# Altium footprint library STM32F0.PcbLib: 228 footprints (part 16 of 16)
Each footprint in its own frame and in the unit in brackets; x right, y up, seen from the top. Pads: shape width x height; smd on the part's side, far side on the other; paste and mask are expansions set on the pad; w line width, h text height; cw(c..) or ccw(c..) is an arc to the next point about the centre after c.
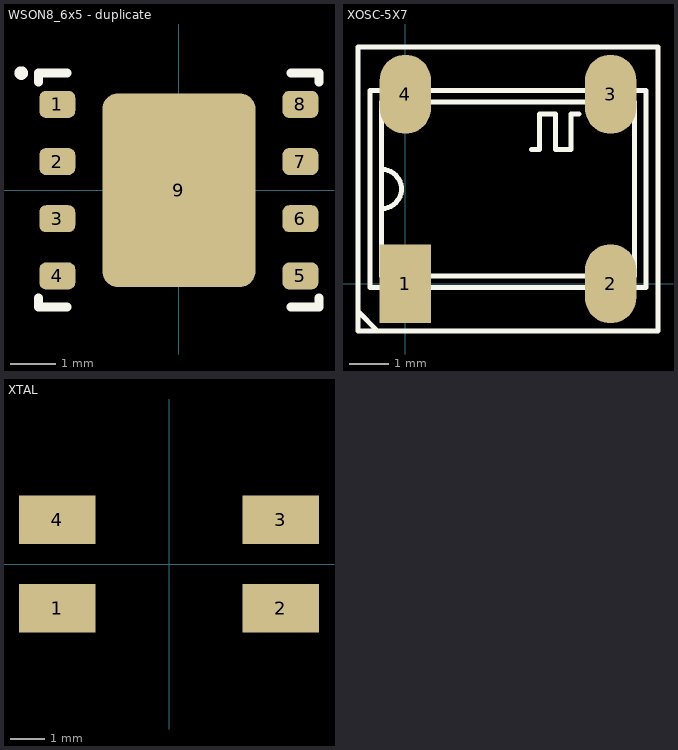
[diagram p15: the footprints below, top view; thin cyan lines are the x and y axes]

## WSON8_6x5 - duplicate [mm]
pads (9):
  rrect50% 0.8x0.6 smd: 1(-2.7,1.905) 2(-2.7,0.635) 3(-2.7,-0.635) 4(-2.7,-1.905) 5(2.7,-1.905) 6(2.7,-0.635) 7(2.7,0.635) 8(2.7,1.905)
  rrect20% 3.4x4.3 smd paste+0 mask+0: 9(0,0)
Top Overlay:
  circle w0.2: c-3.5,2.6 r0.05
  lines w0.2: -3.112,-2.4 -3.112,-2.6 -2.488,-2.6 ; -3.112,2.4 -3.112,2.6 -2.488,2.6 ; 2.488,-2.6 3.112,-2.6 3.112,-2.4 ; 2.488,2.6 3.112,2.6 3.112,2.4
3D body "WSON8_6x5.STEP": height 0.8, standoff 0, extent -2.999,-2.5 3.001,2.5

## XOSC-5X7 [mm]
pads (4):
  rect 1.3x2 smd: 1(0,0)
  oval 1.3x2 smd: 2(5.2,0) 3(5.2,4.8) 4(0,4.8)
Top Overlay:
  lines w0.127: -1.2,-0.9 -1.2,-0.7 -0.7,-1.2 -0.6,-1.2 ; -0.6,1.9 ccw(c-0.6,2.4) -0.6,2.9 ; 3.2,3.4 3.4,3.4 3.4,4.3 3.8,4.3 3.8,3.4 4.2,3.4 4.2,4.3 4.4,4.3 ; -1.2,-1.2 3.5,-1.2 6.4,-1.2 6.4,6 -1.2,6 -1.2,-1.2 ; -0.9,-0.1 -0.9,4.9 6.1,4.9 6.1,-0.1 -0.9,-0.1 ; -0.6,0.2 -0.6,4.6 5.8,4.6 5.8,0.2 -0.6,0.2
3D body: height 2.03, standoff 1.3, extent -0.381,0.508 5.588,4.318
3D body: height 1.3, standoff 1.27, extent -0.508,0.381 5.715,4.445
3D body: height 1.3, standoff 0, extent 4.748,-0.089 5.663,0.292
3D body: height 1.3, standoff 0, extent -0.452,-0.09 0.463,0.635
3D body: height 1.3, standoff 0, extent -0.463,4.508 0.452,4.889
3D body: height 1.3, standoff 0, extent 4.737,4.508 5.651,4.889
3D body: height 1.27, standoff 0, extent -0.914,-0.076 6.096,4.877

## XTAL [mm]
pads (4):
  rect 2.2x1.4 smd: 1(-3.2,-1.27) 2(3.2,-1.27) 3(3.2,1.27) 4(-3.2,1.27)
3D body "User Library-FT7A.step": height 1.15, standoff 0, extent -3.575,-2.54 3.575,2.61

## XTAL(HC-49SM) [mm]